# Altium footprint library Burn Wire Dev Board.PcbLib: 40 footprints (part 3 of 3)
Each footprint in its own frame and in the unit in brackets; x right, y up, seen from the top. Pads: shape width x height; smd on the part's side, far side on the other; paste and mask are expansions set on the pad; w line width, h text height; cw(c..) or ccw(c..) is an arc to the next point about the centre after c.
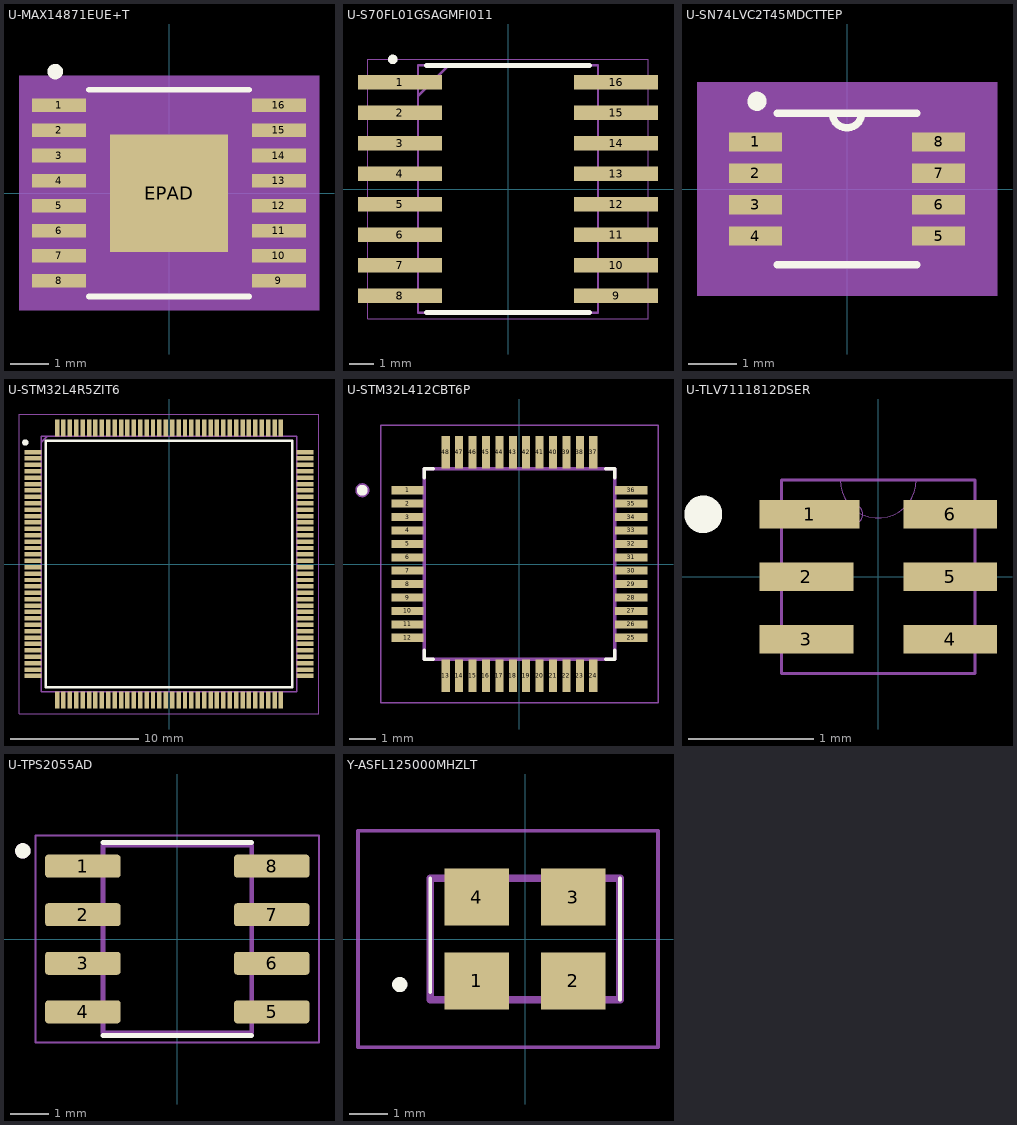
[diagram p2: the footprints below, top view; thin cyan lines are the x and y axes]

## U-MAX14871EUE+T [mm]
pads (17):
  rect 1.4x0.35 smd paste+0 mask+0: 1(-2.845,2.275) 2(-2.845,1.625) 3(-2.845,0.975) 4(-2.845,0.325) 5(-2.845,-0.325) 6(-2.845,-0.975) 7(-2.845,-1.625) 8(-2.845,-2.275) 9(2.845,-2.275) 10(2.845,-1.625) 11(2.845,-0.975) 12(2.845,-0.325) 13(2.845,0.325) 14(2.845,0.975) 15(2.845,1.625) 16(2.845,2.275)
  rect 3.05x3.05 smd paste-1.537 mask+0: EPAD(0,0)
Top Overlay:
  circle w0.2: c-2.946,3.15 r0.1
  lines w0.152: -2.069,-2.68 2.069,-2.68 ; -2.069,2.68 2.069,2.68
Top Paste:
  region: 1.449,-0.1 0.1,-0.1 0.1,-1.449 1.449,-1.449
  region: 1.449,1.449 0.1,1.449 0.1,0.1 1.449,0.1
  region: -0.1,-0.1 -1.449,-0.1 -1.449,-1.449 -0.1,-1.449
  region: -0.1,1.449 -1.449,1.449 -1.449,0.1 -0.1,0.1
Mechanical 5:
  region: 3.886,-3.035 -3.886,-3.035 -3.886,3.035 3.886,3.035
Mechanical 13:
  lines w0: -0.305,2.553 ccw(c0,2.553) 0.305,2.553
  lines w0.025: -3.251,-2.427 -2.248,-2.427 -2.248,-2.123 -3.251,-2.123 -3.251,-2.427 ; -3.251,-1.777 -2.248,-1.777 -2.248,-1.473 -3.251,-1.473 -3.251,-1.777 ; -3.251,-1.127 -2.248,-1.127 -2.248,-0.823 -3.251,-0.823 -3.251,-1.127 ; -3.251,-0.477 -2.248,-0.477 -2.248,-0.173 -3.251,-0.173 -3.251,-0.477 ; -3.251,0.173 -2.248,0.173 -2.248,0.477 -3.251,0.477 -3.251,0.173 ; -3.251,0.823 -2.248,0.823 -2.248,1.127 -3.251,1.127 -3.251,0.823 ; -3.251,1.473 -2.248,1.473 -2.248,1.777 -3.251,1.777 -3.251,1.473 ; -3.251,2.123 -2.248,2.123 -2.248,2.427 -3.251,2.427 -3.251,2.123 ; -2.248,-2.553 -2.248,2.553 2.248,2.553 2.248,-2.553 -2.248,-2.553 ; 2.248,-2.427 3.251,-2.427 3.251,-2.123 2.248,-2.123 2.248,-2.427 ; 2.248,-1.777 3.251,-1.777 3.251,-1.473 2.248,-1.473 2.248,-1.777 ; 2.248,-1.127 3.251,-1.127 3.251,-0.823 2.248,-0.823 2.248,-1.127 ; 2.248,-0.477 3.251,-0.477 3.251,-0.173 2.248,-0.173 2.248,-0.477 ; 2.248,0.173 3.251,0.173 3.251,0.477 2.248,0.477 2.248,0.173 ; 2.248,0.823 3.251,0.823 3.251,1.127 2.248,1.127 2.248,0.823 ; 2.248,1.473 3.251,1.473 3.251,1.777 2.248,1.777 2.248,1.473 ; 2.248,2.123 3.251,2.123 3.251,2.427 2.248,2.427 2.248,2.123
  text "*" at -2.184,1.206 h1.27
3D body "21-0108_U16E+3_MXM.step": height 1.09, standoff -0.05, extent -3.251,-2.553 3.251,2.553

## U-S70FL01GSAGMFI011 [mm]
pads (16):
  rect 3.5x0.6 smd: 1(-4.5,4.445) 2(-4.5,3.175) 3(-4.5,1.905) 4(-4.5,0.635) 5(-4.5,-0.635) 6(-4.5,-1.905) 7(-4.5,-3.175) 8(-4.5,-4.445) 9(4.5,-4.445) 10(4.5,-3.175) 11(4.5,-1.905) 12(4.5,-0.635) 13(4.5,0.635) 14(4.5,1.905) 15(4.5,3.175) 16(4.5,4.445)
Top Overlay:
  circle w0.2: c-4.8,5.4 r0.1
  lines w0.2: -3.4,-5.15 3.4,-5.15 ; -3.4,5.15 3.4,5.15
Mechanical 13:
  lines w0.1: -3.75,3.88 -2.48,5.15 ; -3.75,-5.15 -3.75,5.15 3.75,5.15 3.75,-5.15 -3.75,-5.15
Mechanical 15:
  lines w0.05: -5.85,-5.4 -5.85,5.4 5.85,5.4 5.85,-5.4 -5.85,-5.4
3D body "S70FL01GSAGMFI011.stp": height 2.65, standoff 0, extent -5.15,-5.15 5.15,5.15

## U-SN74LVC2T45MDCTTEP [mm]
pads (8):
  rect 1.1x0.4 smd: 1(-1.9,0.975) 2(-1.9,0.325) 3(-1.9,-0.325) 4(-1.9,-0.975) 5(1.9,-0.975) 6(1.9,-0.325) 7(1.9,0.325) 8(1.9,0.975)
Top Overlay:
  circle w0.2: c-1.867,1.819 r0.1
  lines w0.152: -1.448,-1.575 1.448,-1.575 ; -1.448,1.575 1.448,1.575 ; -0.305,1.575 ccw(c0,1.575) 0.305,1.575
Mechanical 5:
  region: 3.111,-2.21 -3.111,-2.21 -3.111,2.21 3.111,2.21
Mechanical 13:
  lines w0: -0.305,1.575 ccw(c0,1.575) 0.305,1.575
  lines w0.025: -2.121,-1.127 -2.121,-0.823 -1.448,-0.823 -1.448,-1.127 -2.121,-1.127 ; -2.121,-0.477 -2.121,-0.173 -1.448,-0.173 -1.448,-0.477 -2.121,-0.477 ; -2.121,0.173 -2.121,0.477 -1.448,0.477 -1.448,0.173 -2.121,0.173 ; -2.121,0.823 -2.121,1.127 -1.448,1.127 -1.448,0.823 -2.121,0.823 ; -1.448,-1.575 1.448,-1.575 1.448,1.575 -1.448,1.575 -1.448,-1.575 ; 1.448,-1.127 1.448,-0.823 2.121,-0.823 2.121,-1.127 1.448,-1.127 ; 1.448,-0.477 1.448,-0.173 2.121,-0.173 2.121,-0.477 1.448,-0.477 ; 1.448,0.173 1.448,0.477 2.121,0.477 2.121,0.173 1.448,0.173 ; 1.448,0.823 1.448,1.127 2.121,1.127 2.121,0.823 1.448,0.823
  text "*" at -2.267,1.204 h1.27
Mechanical 15:
  region: 2.73,-1.829 -2.73,-1.829 -2.73,1.829 2.73,1.829
  lines w0.152: -2.73,-1.829 -2.73,1.829 2.73,1.829 2.73,-1.829 -2.73,-1.829
3D body "DCT0008A.stp": height 0.91, standoff 0, extent -2.01,-1.475 2.011,1.475
3D body: height 0.25, standoff 0, extent 0,0 0.254,0.254

## U-STM32L4R5ZIT6 [mm]
pads (144):
  rect 1.35x0.35 smd mask+0.051: 1(-10.625,8.75) 2(-10.625,8.25) 3(-10.625,7.75) 4(-10.625,7.25) 5(-10.625,6.75) 6(-10.625,6.25) 7(-10.625,5.75) 8(-10.625,5.25) 9(-10.625,4.75) 10(-10.625,4.25) 11(-10.625,3.75) 12(-10.625,3.25) 13(-10.625,2.75) 14(-10.625,2.25) 15(-10.625,1.75) 17(-10.625,0.75) 18(-10.625,0.25) 19(-10.625,-0.25) 20(-10.625,-0.75) 21(-10.625,-1.25) 22(-10.625,-1.75) 23(-10.625,-2.25) 24(-10.625,-2.75) 25(-10.625,-3.25) 26(-10.625,-3.75) 27(-10.625,-4.25) 28(-10.625,-4.75) 29(-10.625,-5.25) 30(-10.625,-5.75) 31(-10.625,-6.25) 32(-10.625,-6.75) 33(-10.625,-7.25) 34(-10.625,-7.75) 35(-10.625,-8.25) 36(-10.625,-8.75) 73(10.625,-8.75) 74(10.625,-8.25) 75(10.625,-7.75) 76(10.625,-7.25) 77(10.625,-6.75) 78(10.625,-6.25) 79(10.625,-5.75) 80(10.625,-5.25) 81(10.625,-4.75) 82(10.625,-4.25) 83(10.625,-3.75) 84(10.625,-3.25) 85(10.625,-2.75) 86(10.625,-2.25) 87(10.625,-1.75) 88(10.625,-1.25) 89(10.625,-0.75) 90(10.625,-0.25) 91(10.625,0.25) 92(10.625,0.75) 93(10.625,1.25) 94(10.625,1.75) 95(10.625,2.25) 96(10.625,2.75) 97(10.625,3.25) 98(10.625,3.75) 99(10.625,4.25) 100(10.625,4.75) 101(10.625,5.25) 102(10.625,5.75) 103(10.625,6.25) 104(10.625,6.75) 105(10.625,7.25) 106(10.625,7.75) 107(10.625,8.25) 108(10.625,8.75)
  rect 1.35x0.35 smd paste+0 mask+0.051: 16(-10.625,1.25)
  rect 0.35x1.35 smd mask+0.051: 37(-8.75,-10.625) 38(-8.25,-10.625) 39(-7.75,-10.625) 40(-7.25,-10.625) 41(-6.75,-10.625) 42(-6.25,-10.625) 43(-5.75,-10.625) 44(-5.25,-10.625) 45(-4.75,-10.625) 46(-4.25,-10.625) 47(-3.75,-10.625) 48(-3.25,-10.625) 49(-2.75,-10.625) 50(-2.25,-10.625) 51(-1.75,-10.625) 52(-1.25,-10.625) 53(-0.75,-10.625) 54(-0.25,-10.625) 55(0.25,-10.625) 56(0.75,-10.625) 57(1.25,-10.625) 58(1.75,-10.625) 59(2.25,-10.625) 60(2.75,-10.625) 61(3.25,-10.625) 62(3.75,-10.625) 63(4.25,-10.625) 64(4.75,-10.625) 65(5.25,-10.625) 66(5.75,-10.625) 67(6.25,-10.625) 68(6.75,-10.625) 69(7.25,-10.625) 70(7.75,-10.625) 71(8.25,-10.625) 72(8.75,-10.625) 109(8.75,10.625) 110(8.25,10.625) 111(7.75,10.625) 112(7.25,10.625) 113(6.75,10.625) 114(6.25,10.625) 115(5.75,10.625) 116(5.25,10.625) 117(4.75,10.625) 118(4.25,10.625) 119(3.75,10.625) 120(3.25,10.625) 121(2.75,10.625) 122(2.25,10.625) 123(1.75,10.625) 124(1.25,10.625) 125(0.75,10.625) 126(0.25,10.625) 127(-0.25,10.625) 128(-0.75,10.625) 129(-1.25,10.625) 130(-1.75,10.625) 131(-2.25,10.625) 132(-2.75,10.625) 133(-3.25,10.625) 134(-3.75,10.625) 135(-4.25,10.625) 136(-4.75,10.625) 137(-5.25,10.625) 138(-5.75,10.625) 139(-6.25,10.625) 140(-6.75,10.625) 141(-7.25,10.625) 142(-7.75,10.625) 143(-8.25,10.625) 144(-8.75,10.625)
Top Overlay:
  circle w0.25: c-11.225,9.5 r0.125
  lines w0.2: -9.65,-9.65 9.65,-9.65 9.65,9.65 -9.65,9.65 -9.65,-9.65
Mechanical 13:
  lines w0.1: -10,9.5 -9.5,10 ; -10,-10 10,-10 10,10 -10,10 -10,-10
Mechanical 15:
  lines w0.05: -11.725,-11.725 11.725,-11.725 11.725,11.725 -11.725,11.725 -11.725,-11.725
3D body "STM32L4R5ZIT6.stp": height 1.6, standoff 0, extent -11,-11 11,11

## U-STM32L412CBT6P [mm]
pads (48):
  rrect0% 1.2x0.3 smd: 1(-4.17,2.75) 2(-4.17,2.25) 3(-4.17,1.75) 4(-4.17,1.25) 5(-4.17,0.75) 6(-4.17,0.25) 7(-4.17,-0.25) 8(-4.17,-0.75) 9(-4.17,-1.25) 10(-4.17,-1.75) 11(-4.17,-2.25) 12(-4.17,-2.75) 25(4.17,-2.75) 26(4.17,-2.25) 27(4.17,-1.75) 28(4.17,-1.25) 29(4.17,-0.75) 30(4.17,-0.25) 31(4.17,0.25) 32(4.17,0.75) 33(4.17,1.25) 34(4.17,1.75) 35(4.17,2.25) 36(4.17,2.75)
  rrect0% 0.3x1.2 smd: 13(-2.75,-4.17) 14(-2.25,-4.17) 15(-1.75,-4.17) 16(-1.25,-4.17) 17(-0.75,-4.17) 18(-0.25,-4.17) 19(0.25,-4.17) 20(0.75,-4.17) 21(1.25,-4.17) 22(1.75,-4.17) 23(2.25,-4.17) 24(2.75,-4.17) 37(2.75,4.17) 38(2.25,4.17) 39(1.75,4.17) 40(1.25,4.17) 41(0.75,4.17) 42(0.25,4.17) 43(-0.25,4.17) 44(-0.75,4.17) 45(-1.25,4.17) 46(-1.75,4.17) 47(-2.25,4.17) 48(-2.75,4.17)
Top Overlay:
  circle w0.2: c-5.86,2.75 r0.1
  lines w0.127: -3.55,-3.21 -3.55,-3.55 -3.21,-3.55 ; -3.55,3.21 -3.55,3.55 -3.21,3.55 ; 3.21,-3.55 3.55,-3.55 3.55,-3.21 ; 3.21,3.55 3.55,3.55 3.55,3.21
Mechanical 13:
  circle w0.2: c-5.86,2.75 r0.162
  lines w0.127: -3.55,-3.55 3.55,-3.55 3.55,3.55 -3.55,3.55 -3.55,-3.55
Mechanical 15:
  lines w0.05: -5.165,-5.165 5.165,-5.165 5.165,5.165 -5.165,5.165 -5.165,-5.165
3D body "STM32L412CBT6P.STEP": height 1.59, standoff -0.01, extent -4.5,-4.5 4.5,4.5

## U-TLV7111812DSER [mm]
pads (12):
  rect 0.8x0.23 smd paste-0.14 mask+0: 1(-0.55,0.5)
  rect 0.75x0.23 smd paste-0.14 mask+0: 2(-0.575,0) 3(-0.575,-0.5) 4(0.575,-0.5) 5(0.575,0) 6(0.575,0.5)
  rect 0.75x0.23 on Top Paste paste-0.14 mask+0: ""(-0.575,-0.5) ""(-0.575,0) ""(0.575,-0.5) ""(0.575,0) ""(0.575,0.5)
  rect 0.8x0.23 on Top Paste paste-0.14 mask+0: ""(-0.55,0.5)
Top Overlay:
  circle w0.2: c-1.4,0.5 r0.051
Mechanical 13:
  circle w0: c-0.2,0.5 r0.076
  lines w0: -0.305,0.775 ccw(c0,0.775) 0.305,0.775
  lines w0.025: -0.775,-0.775 -0.775,0.775 0.775,0.775 0.775,-0.775 -0.775,-0.775
3D body "DSE6_TEX.step": height 0.8, standoff 0, extent -0.775,-0.775 0.775,0.775

## U-TPS2055AD [mm]
pads (8):
  rrect25% 1.97x0.6 smd: 1(-2.47,1.905) 2(-2.47,0.635) 3(-2.47,-0.635) 4(-2.47,-1.905) 5(2.47,-1.905) 6(2.47,-0.635) 7(2.47,0.635) 8(2.47,1.905)
Top Overlay:
  circle w0.2: c-4.04,2.305 r0.1
  lines w0.127: -1.947,-2.525 1.947,-2.525 ; -1.947,2.525 1.947,2.525
Mechanical 13:
  circle w0.2: c-4.04,2.305 r0.1
  lines w0.127: -1.947,-2.452 1.947,-2.452 1.947,2.452 -1.947,2.452 -1.947,-2.452
Mechanical 15:
  lines w0.05: -3.705,-2.702 3.705,-2.702 3.705,2.702 -3.705,2.702 -3.705,-2.702
3D body "D0008A.stp": height 1.63, standoff 0, extent -3.011,-2.451 3.011,2.451

## Y-ASFL125000MHZLT [mm]
pads (4):
  rect 1.7x1.5 smd: 1(-1.27,-1.1) 2(1.27,-1.1) 3(1.27,1.1) 4(-1.27,1.1)
Top Overlay:
  lines w0.1: -2.5,-1.4 -2.5,1.6 ; 2.5,-1.6 2.5,1.6
  lines w0.2: -3.4,-1.2 ccw(c-3.3,-1.2) -3.2,-1.2 ccw(c-3.3,-1.2) -3.4,-1.2
Mechanical 13:
  lines w0.2: -2.5,-1.6 2.5,-1.6 2.5,1.6 -2.5,1.6 -2.5,-1.6
Mechanical 15:
  lines w0.1: -4.4,-2.85 3.5,-2.85 3.5,2.85 -4.4,2.85 -4.4,-2.85
3D body "ASFL1-25.000MHZ-L-T.stp": height 1.4, standoff 0, extent -2.5,-1.7 2.5,1.7